# Altium footprint library Module.PcbLib: 57 footprints (part 1 of 4)
Each footprint in its own frame and in the unit in brackets; x right, y up, seen from the top. Pads: shape width x height; smd on the part's side, far side on the other; paste and mask are expansions set on the pad; w line width, h text height; cw(c..) or ccw(c..) is an arc to the next point about the centre after c.
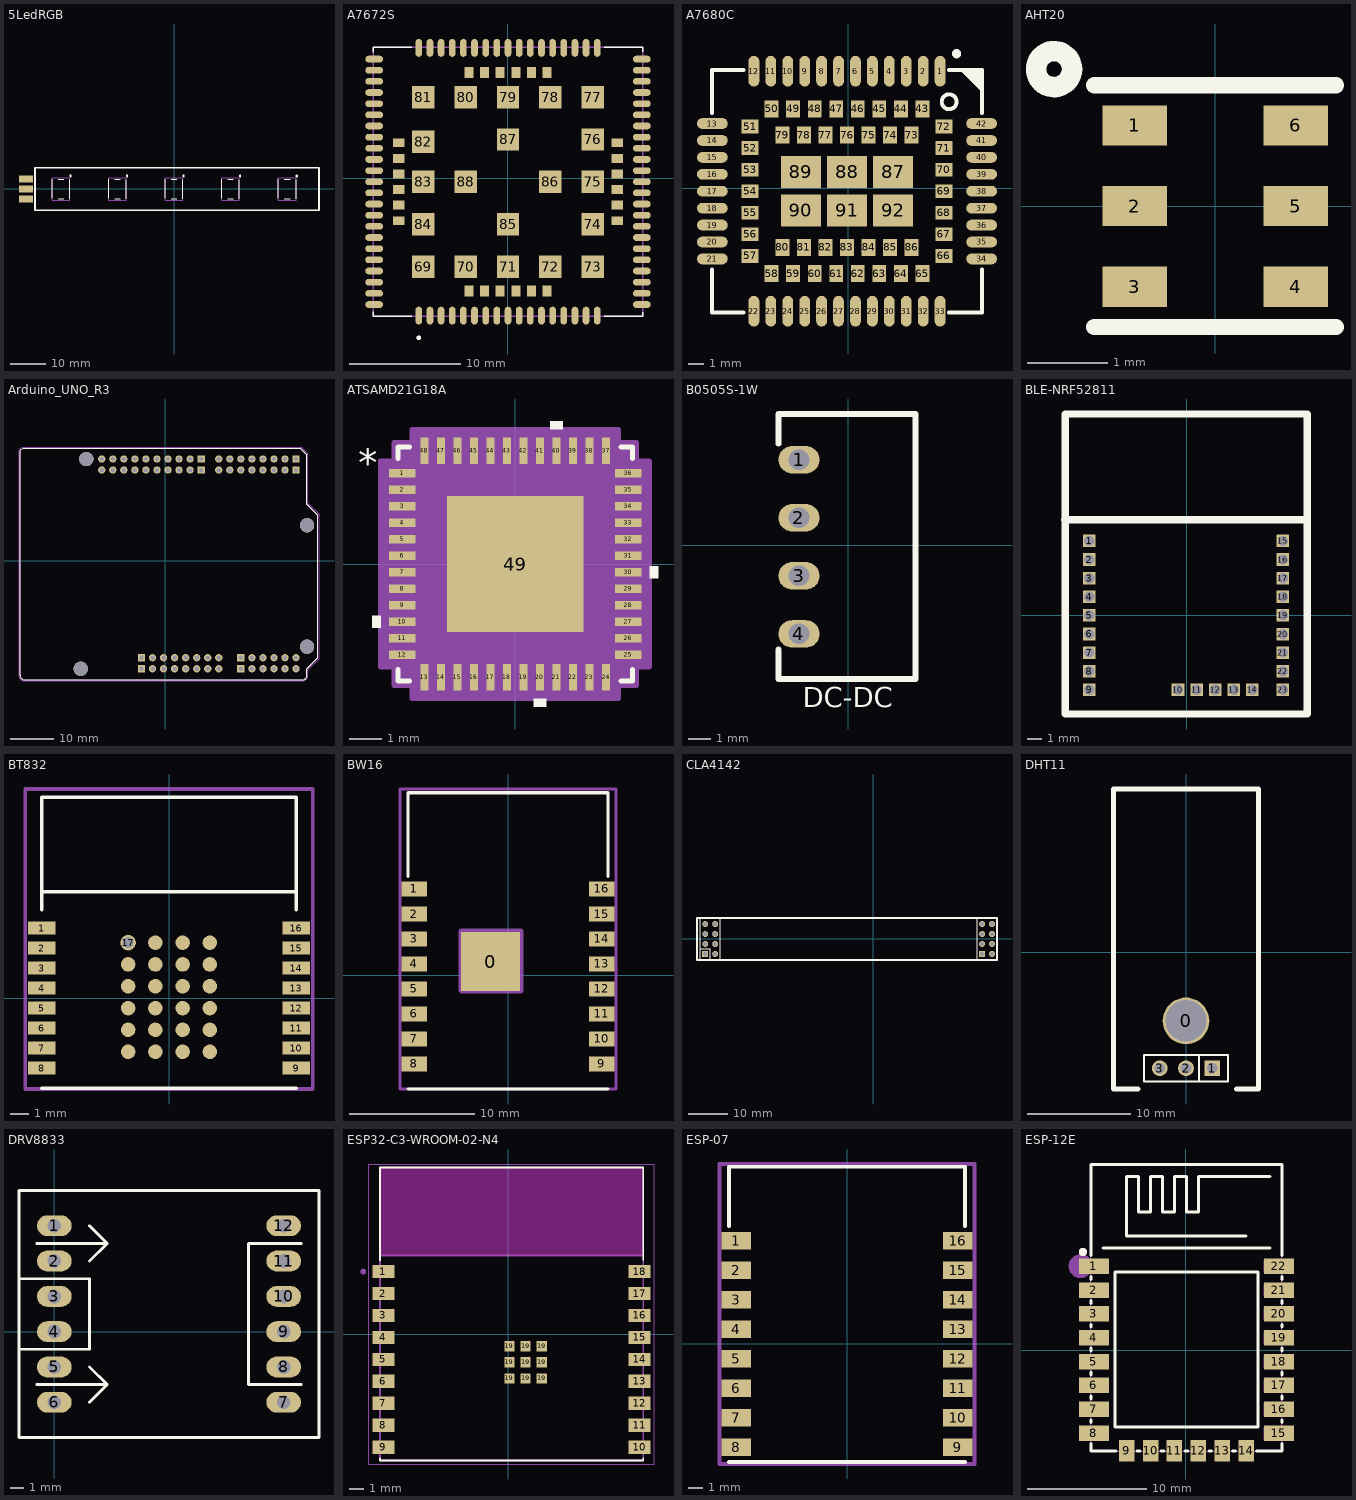
[diagram p0: the footprints below, top view; thin cyan lines are the x and y axes]

## 5LedRGB [mm]
pads (3):
  rrect0% 4x2 smd: 1(-41.875,-2.8) 2(-41.875,0) 3(-41.875,2.8)
Top Overlay:
  circle w0.254: c-29.3,3.7 r0.224
  circle w0.254: c-13.3,3.7 r0.224
  circle w0.254: c34.7,3.7 r0.224
  circle w0.254: c18.7,3.7 r0.224
  circle w0.254: c2.7,3.7 r0.224
  lines w0.2: -34.5,-2.675 -34.5,2.725 ; -32.8,-2.725 -31.2,-2.725 ; -32.8,2.725 -31.2,2.725 ; -29.5,-2.725 -29.5,2.675 ; -18.5,-2.675 -18.5,2.725 ; -16.8,-2.725 -15.2,-2.725 ; -16.8,2.725 -15.2,2.725 ; -13.5,-2.725 -13.5,2.675 ; -2.5,-2.675 -2.5,2.725 ; -0.8,-2.725 0.8,-2.725 ; -0.8,2.725 0.8,2.725 ; 2.5,-2.725 2.5,2.675 ; 13.5,-2.675 13.5,2.725 ; 15.2,-2.725 16.8,-2.725 ; 15.2,2.725 16.8,2.725 ; 18.5,-2.725 18.5,2.675 ; 29.5,-2.675 29.5,2.725 ; 31.2,-2.725 32.8,-2.725 ; 31.2,2.725 32.8,2.725 ; 34.5,-2.725 34.5,2.675
  lines w0.5: -39.375,-6 -39.375,6 41,6 41,-6 -39.375,-6
Mechanical 13:
  lines w0.2: -34.5,-3.2 -29.5,-3.2 -29.5,3.2 -34.5,3.2 -34.5,-3.2 ; -18.5,-3.2 -13.5,-3.2 -13.5,3.2 -18.5,3.2 -18.5,-3.2 ; -2.5,-3.2 2.5,-3.2 2.5,3.2 -2.5,3.2 -2.5,-3.2 ; 13.5,-3.2 18.5,-3.2 18.5,3.2 13.5,3.2 13.5,-3.2 ; 29.5,-3.2 34.5,-3.2 34.5,3.2 29.5,3.2 29.5,-3.2
3D body "User Library-ws2812B-1.STEP": height 1.55, standoff -0.02, extent -34.5,-2.725 -29.5,2.675
3D body "User Library-ws2812B-1.STEP": height 1.55, standoff -0.02, extent -18.5,-2.725 -13.5,2.675
3D body "User Library-ws2812B-1.STEP": height 1.55, standoff -0.02, extent 29.5,-2.725 34.5,2.675
3D body "User Library-ws2812B-1.STEP": height 1.55, standoff -0.02, extent 13.5,-2.725 18.5,2.675
3D body "User Library-ws2812B-1.STEP": height 1.55, standoff -0.02, extent -2.5,-2.725 2.5,2.675

## A7672S [mm]
pads (124):
  oval 0.6x1.6 smd: 1(-8,-12.33) 2(-7,-12.33) 3(-6,-12.33) 4(-5,-12.33) 5(-4,-12.33) 6(-3,-12.33) 7(-2,-12.33) 8(-1,-12.33) 9(0,-12.33) 10(1,-12.33) 11(2,-12.33) 12(3,-12.33) 13(4,-12.33) 14(5,-12.33) 15(6,-12.33) 16(7,-12.33) 17(8,-12.33) 35(8,11.67) 36(7,11.67) 37(6,11.67) 38(5,11.67) 39(4,11.67) 40(3,11.67) 41(2,11.67) 42(1,11.67) 43(0,11.67) 44(-1,11.67) 45(-2,11.67) 46(-3,11.67) 47(-4,11.67) 48(-5,11.67) 49(-6,11.67) 50(-7,11.67) 51(-8,11.67)
  oval 1.6x0.6 smd: 18(12,-8.33) 19(12,-7.33) 20(12,-6.33) 21(12,-5.33) 22(12,-4.33) 23(12,-3.33) 24(12,-2.33) 25(12,-1.33) 26(12,-0.33) 27(12,0.67) 28(12,1.67) 29(12,2.67) 30(12,3.67) 31(12,4.67) 32(12,5.67) 33(12,6.67) 34(12,7.67) 52(-12,7.67) 53(-12,6.67) 54(-12,5.67) 55(-12,4.67) 56(-12,3.67) 57(-12,2.67) 58(-12,1.67) 59(-12,0.67) 60(-12,-0.33) 61(-12,-1.33) 62(-12,-2.33) 63(-12,-3.33) 64(-12,-4.33) 65(-12,-5.33) 66(-12,-6.33) 67(-12,-7.33) 68(-12,-8.33) 89(12,-11.34) 90(12,-10.34) 91(12,-9.33) 92(12,8.67) 93(12,9.67) 94(12,10.67) 95(-12,10.67) 96(-12,9.67) 97(-12,8.67) 98(-12,-9.34) 99(-12,-10.34) 100(-12,-11.34)
  rect 2x2 smd: 69(-7.6,-7.941) 70(-3.8,-7.941) 71(0,-7.941) 72(3.8,-7.941) 73(7.6,-7.941) 74(7.6,-4.141) 75(7.6,-0.341) 76(7.6,3.459) 77(7.6,7.259) 78(3.8,7.259) 79(0,7.259) 80(-3.8,7.259) 81(-7.6,7.259) 82(-7.6,3.259) 83(-7.6,-0.341) 84(-7.6,-4.141) 85(0,-4.141) 86(3.8,-0.341) 87(0,3.459) 88(-3.8,-0.341)
  rect 0.8x1 smd: 101(-3.5,-10.14) 102(-2.1,-10.14) 103(-0.7,-10.14) 104(0.7,-10.14) 105(2.1,-10.14) 106(3.5,-10.14) 113(3.5,9.46) 114(2.1,9.46) 115(0.7,9.46) 116(-0.7,9.46) 117(-2.1,9.46) 118(-3.5,9.46)
  rect 1x0.8 smd: 107(9.8,-3.83) 108(9.8,-2.43) 109(9.8,-1.03) 110(9.8,0.37) 111(9.8,1.77) 112(9.8,3.17) 119(-9.8,3.17) 120(-9.8,1.77) 121(-9.8,0.37) 122(-9.8,-1.03) 123(-9.8,-2.43) 124(-9.8,-3.83)
Top Overlay:
  circle w0.2: c-8,-14.33 r0.1
  lines w0.127: -12.075,-12 -12.075,-12.405 -8.62,-12.405 ; -12.075,11.292 -12.075,11.745 -8.62,11.745 ; 8.62,-12.405 12.075,-12.405 12.075,-12.025 ; 8.62,11.745 12.075,11.745 12.075,11.343
Mechanical 13:
  circle w0.2: c-8,-14.33 r0.1
  lines w0.127: -12.075,-12.405 12.075,-12.405 12.075,11.745 -12.075,11.745 -12.075,-12.405
3D body: height 0.6, standoff 0, extent -12.09,-12.37 11.938,11.684
3D body: height 1.2, standoff 0.6, extent -11.557,-11.963 11.633,11.227

## A7680C [mm]
pads (92):
  oval 0.7x2 smd paste+0 mask+0.05: 1(5.971,7.61) 2(4.871,7.61) 3(3.771,7.61) 4(2.671,7.61) 5(1.571,7.61) 6(0.471,7.61) 7(-0.629,7.61) 8(-1.729,7.61) 9(-2.829,7.61) 10(-3.929,7.61) 11(-5.029,7.61) 12(-6.129,7.61) 22(-6.129,-7.99) 23(-5.029,-7.99) 24(-3.929,-7.99) 25(-2.829,-7.99) 26(-1.729,-7.99) 27(-0.629,-7.99) 28(0.471,-7.99) 29(1.571,-7.99) 30(2.671,-7.99) 31(3.771,-7.99) 32(4.871,-7.99) 33(5.971,-7.99)
  oval 2x0.7 smd paste+0 mask+0.05: 13(-8.829,4.21) 14(-8.829,3.11) 15(-8.829,2.01) 16(-8.829,0.91) 17(-8.829,-0.19) 18(-8.829,-1.29) 19(-8.829,-2.39) 20(-8.829,-3.49) 21(-8.829,-4.59) 34(8.671,-4.59) 35(8.671,-3.49) 36(8.671,-2.39) 37(8.671,-1.29) 38(8.671,-0.19) 39(8.671,0.91) 40(8.671,2.01) 41(8.671,3.11) 42(8.671,4.21)
  rect 0.9x1.1 smd paste+0 mask+0.05: 43(4.821,5.16) 44(3.421,5.16) 45(2.021,5.16) 46(0.621,5.16) 47(-0.779,5.16) 48(-2.179,5.16) 49(-3.579,5.16) 50(-4.979,5.16) 58(-4.979,-5.54) 59(-3.579,-5.54) 60(-2.179,-5.54) 61(-0.779,-5.54) 62(0.621,-5.54) 63(2.021,-5.54) 64(3.421,-5.54) 65(4.821,-5.54) 73(4.121,3.46) 74(2.721,3.46) 75(1.321,3.46) 76(-0.079,3.46) 77(-1.479,3.46) 78(-2.879,3.46) 79(-4.279,3.46) 80(-4.279,-3.84) 81(-2.879,-3.84) 82(-1.479,-3.84) 83(-0.079,-3.84) 84(1.321,-3.84) 85(2.721,-3.84) 86(4.121,-3.84)
  rect 1.1x0.9 smd paste+0 mask+0.05: 51(-6.379,4.01) 52(-6.379,2.61) 53(-6.379,1.21) 54(-6.379,-0.19) 55(-6.379,-1.59) 56(-6.379,-2.99) 57(-6.379,-4.39) 66(6.221,-4.39) 67(6.221,-2.99) 68(6.221,-1.59) 69(6.221,-0.19) 70(6.221,1.21) 71(6.221,2.61) 72(6.221,4.01)
  rect 2.6x2.1 smd paste+0 mask+0.05: 87(2.921,1.06) 88(-0.079,1.06) 89(-3.079,1.06) 90(-3.079,-1.44) 91(-0.079,-1.44) 92(2.921,-1.44)
Top Overlay:
  circle w0.254: c6.562,5.628 r0.484
  circle w0.3: c7.046,8.75 r0.15
  region: 8.684,6.287 8.684,7.684 7.287,7.684
  lines w0.254: -8.842,-5.27 -8.842,-8.064 -6.81,-8.064 ; -8.842,4.89 -8.842,7.684 -6.81,7.684 ; 6.552,-8.064 8.684,-8.064 8.684,-5.27 ; 6.552,7.684 8.684,7.684 8.684,4.89
Mechanical 15:
  region: 8.684,6.287 8.684,7.684 7.287,7.684

## AHT20 [mm]
pads (6):
  rect 0.8x0.5 smd: 1(-1,1) 2(-1,0) 3(-1,-1) 4(1,-1) 5(1,0) 6(1,1)
Top Overlay:
  circle w0.254: c-2,1.7 r0.224
  lines w0.2: -1.5,-1.5 1.5,-1.5 ; -1.5,1.5 1.5,1.5
3D body: height 1, standoff 0, extent -1.5,-1.5 1.5,1.5

## Arduino_UNO_R3 [mil]
pads (68):
  round 66 hole 40: 3V3(85,-980.32) 3V3(85,-880.32) 5V(185,-980.32) 5V(185,-880.32) A1(785,-980.32) A1(785,-880.32) A2(885,-980.32) A2(885,-880.32) A3(985,-980.32) A3(985,-880.32) A4(1085,-980.32) A4(1085,-880.32) A5(1185,-980.32) A5(1185,-880.32) AD4/SDA(-475,819.68) AD4/SDA(-475,919.68) AD5/SCL(-575,819.68) AD5/SCL(-575,919.68) AREF(-375,819.68) AREF(-375,919.68) D1(1085,819.68) D1(1085,919.68) D2(985,819.68) D2(985,919.68) D3(885,819.68) D3(885,919.68) D4(785,819.68) D4(785,919.68) D5(685,819.68) D5(685,919.68) D6(585,819.68) D6(585,919.68) D7(485,819.68) D7(485,919.68) D9(225,819.68) D9(225,919.68) D10(125,819.68) D10(125,919.68) D11(25,819.68) D11(25,919.68) D12(-75,819.68) D12(-75,919.68) D13(-175,819.68) D13(-175,919.68) GND_1(385,-980.32) GND_1(385,-880.32) GND_2(285,-980.32) GND_2(285,-880.32) GND_3(-275,819.68) GND_3(-275,919.68) IOREF(-115,-980.32) IOREF(-115,-880.32) RST(-15,-980.32) RST(-15,-880.32) VIN(485,-980.32) VIN(485,-880.32)
  rect 66x66 / inner round 66 / far side rect 66x66 hole 40: A0(685,-980.32) A0(685,-880.32) D0(1185,819.68) D0(1185,919.68) D8(325,819.68) D8(325,919.68) NC(-215,-980.32) NC(-215,-880.32)
  round 129.92 hole 129.92 unplated: ""(-765,-980.32) ""(-715,919.68) ""(1285,-780.32) ""(1285,319.69)
Top Overlay:
  lines w5: -1315,-1041.22 -1313.33,-1051.21 -1310,-1060.38 -1303.34,-1068.71 -1295.01,-1075.37 -1285.84,-1078.7 -1275.85,-1080.37 1244.09,-1080.37 1254.09,-1078.7 1263.26,-1075.37 1271.59,-1068.71 1278.25,-1060.38 1281.58,-1051.21 1283.25,-1041.22 1283.25,-980.4 1383.21,-880.44 1383.21,408.27 1283.25,508.24 1283.25,958.07 1223.27,1018.06 -1275.85,1018.06 -1285.84,1016.39 -1295.01,1012.22 -1303.34,1006.39 -1310,998.06 -1313.33,988.9 -1315,978.07 -1315,-1041.22
Mechanical 13:
  lines w5: -1315,-1041.22 -1313.33,-1051.21 -1310,-1060.38 -1303.34,-1068.71 -1295.01,-1075.37 -1285.84,-1078.7 -1275.85,-1080.37 1244.09,-1080.37 1254.09,-1078.7 1263.26,-1075.37 1271.59,-1068.71 1278.25,-1060.38 1281.58,-1051.21 1283.25,-1041.22 1283.25,-980.4 1383.21,-880.44 1383.21,408.27 1283.25,508.24 1283.25,958.07 1223.27,1018.06 -1275.85,1018.06 -1285.84,1016.39 -1295.01,1012.22 -1303.34,1006.39 -1310,998.06 -1313.33,988.9 -1315,978.07 -1315,-1041.22
Mechanical 15:
  lines w1.97: -1324.84,-1041.22 -1324.84,-1040.94 -1324.84,987.91 -1323.18,998.74 -1319.84,1007.91 -1313.18,1016.24 -1304.85,1022.07 -1295.69,1026.23 -1285.69,1027.9 1233.11,1027.9 1293.09,967.92 1293.09,518.08 1393.06,418.11 1393.06,-890.28 1293.09,-990.25 1293.09,-1041.22 ; -1324.83,-1040.82 ccw(c-1278.3,-1044.07) -1285.6,-1090.14 ; -1285.69,-1090.21 1244.09,-1090.21 ; 1243.61,-1090.18 ccw(c1241.81,-1038.7) 1293.25,-1041.39
3D body "Assembly Arduino Uno R3.STEP": height 496.56, standoff -137.3, extent -1571,-1064.57 1381.94,1033.86

## ATSAMD21G18A [mil]
pads (49):
  rect 32x10 smd paste+0 mask+0: 1(-137,110) 2(-137,90) 3(-137,70) 4(-137,50) 5(-137,30) 6(-137,10) 7(-137,-10) 8(-137,-30) 9(-137,-50) 10(-137,-70) 11(-137,-90) 12(-137,-110) 25(137,-110) 26(137,-90) 27(137,-70) 28(137,-50) 29(137,-30) 30(137,-10) 31(137,10) 32(137,30) 33(137,50) 34(137,70) 35(137,90) 36(137,110)
  rect 10x32 smd paste+0 mask+0: 13(-110,-137) 14(-90,-137) 15(-70,-137) 16(-50,-137) 17(-30,-137) 18(-10,-137) 19(10,-137) 20(30,-137) 21(50,-137) 22(70,-137) 23(90,-137) 24(110,-137) 37(110,137) 38(90,137) 39(70,137) 40(50,137) 41(30,137) 42(10,137) 43(-10,137) 44(-30,137) 45(-50,137) 46(-70,137) 47(-90,137) 48(-110,137)
  rect 165x165 smd paste-82 mask+0: 49(0,0)
Top Overlay:
  region: -163,-62.5 -173,-62.5 -173,-77.5 -163,-77.5
  region: 37.5,-163 22.5,-163 22.5,-173 37.5,-173
  region: 163,-2.5 173,-2.5 173,-17.5 163,-17.5
  region: 57.5,163 42.5,163 42.5,173 57.5,173
  lines w6: -142,-128.1 -142,-142 -128.1,-142 ; -142,128.1 -142,142 -128.1,142 ; 128.1,-142 142,-142 142,-128.1 ; 128.1,142 142,142 142,128.1
  text "*" at -190.5,95 h59.06
Top Paste:
  region: -31.44,78.56 -78.56,78.56 -78.56,31.44 -31.44,31.44
  region: -31.44,23.56 -78.56,23.56 -78.56,-23.56 -31.44,-23.56
  region: -31.44,-31.44 -78.56,-31.44 -78.56,-78.56 -31.44,-78.56
  region: 23.56,78.56 -23.56,78.56 -23.56,31.44 23.56,31.44
  region: 23.56,23.56 -23.56,23.56 -23.56,-23.56 23.56,-23.56
  region: 23.56,-31.44 -23.56,-31.44 -23.56,-78.56 23.56,-78.56
  region: 78.56,78.56 31.44,78.56 31.44,31.44 78.56,31.44
  region: 78.56,23.56 31.44,23.56 31.44,-23.56 78.56,-23.56
  region: 78.56,-31.44 31.44,-31.44 31.44,-78.56 78.56,-78.56
Mechanical 13:
  drawing of 197 lines, arcs and shapes, not listed
  text "*" at -133.5,95 h59.06
Mechanical 15:
  region: -125,-147 -147,-147 -147,-125 -163,-125 -163,125 -147,125 -147,147 -125,147 -125,163 125,163 125,147 147,147 147,125 163,125 163,-125 147,-125 147,-147 125,-147 125,-163 -125,-163
  lines w6: -163,-125 -147,-125 -147,-147 -125,-147 -125,-163 125,-163 125,-147 147,-147 147,-125 163,-125 163,125 147,125 147,147 125,147 125,163 -125,163 -125,147 -147,147 -147,125 -163,125 -163,-125
3D body "QFN48_7X7MC_MCH.step": height 65.12, standoff 0, extent -140.98,-140.98 140.98,140.98

## B0505S-1W [mm]
pads (4):
  oval 1.8x1.2 hole 0.9: 1(-2.155,3.75) 2(-2.155,1.21) 3(-2.155,-1.33) 4(-2.155,-3.87)
Top Overlay:
  lines w0.254: -3.055,-4.55 -3.055,-5.85 2.945,-5.85 2.945,5.75 -3.055,5.75 -3.055,4.45
  text "DC-DC" at -2,-7.375 h1.5
3D body: height 10.2, standoff 0, extent -3.055,-5.85 2.945,5.75

## BLE-NRF52811 [mm]
pads (23):
  rect 0.86x0.86 hole 0.7: 1(-6.63,5.055) 2(-6.63,3.785) 3(-6.63,2.515) 4(-6.63,1.245) 5(-6.63,-0.025) 6(-6.63,-1.295) 7(-6.63,-2.565) 8(-6.63,-3.835) 9(-6.63,-5.105) 10(-0.585,-5.105) 11(0.685,-5.105) 12(1.955,-5.105) 13(3.225,-5.105) 14(4.495,-5.105) 15(6.578,5.055) 16(6.578,3.785) 17(6.578,2.515) 18(6.578,1.245) 19(6.578,-0.025) 20(6.578,-1.321) 21(6.578,-2.565) 22(6.578,-3.835) 23(6.578,-5.105)
Top Overlay:
  lines w0.5: -8.3,6.5 8.229,6.5 ; -8.281,-6.756 8.229,-6.756 8.229,13.718 -8.281,13.718 -8.281,-6.756
Mechanical 1:
  lines w0.05: -0.803,-5.031 -0.728,-5.105
Mechanical 13:
  text ".Description" at -5.1,-0.4 h2
Mechanical 15:
  text ".Comment" at -4.1,-0.3 h2
3D body "NRF52811_v1.3.step": height 2.1, standoff 0.11, extent -8.331,-6.833 8.179,13.641

## BT832 [mm]
pads (40):
  rect 1.5x0.7 smd: 1(-7,3.85) 2(-7,2.75) 3(-7,1.65) 4(-7,0.55) 5(-7,-0.55) 6(-7,-1.65) 7(-7,-2.75) 8(-7,-3.85) 9(7,-3.85) 10(7,-2.75) 11(7,-1.65) 12(7,-0.55) 13(7,0.55) 14(7,1.65) 15(7,2.75) 16(7,3.85)
  round 0.85 hole 0.6: 17(-2.25,3.05)
  round 0.8 smd: ""(-2.25,-2.95) ""(-2.25,-1.75) ""(-2.25,-0.55) ""(-2.25,0.65) ""(-2.25,1.85) ""(-0.75,-2.95) ""(-0.75,-1.75) ""(-0.75,-0.55) ""(-0.75,0.65) ""(-0.75,1.85) ""(-0.75,3.05) ""(0.75,-2.95) ""(0.75,-1.75) ""(0.75,-0.55) ""(0.75,0.65) ""(0.75,1.85) ""(0.75,3.05) ""(2.25,-2.95) ""(2.25,-1.75) ""(2.25,-0.55) ""(2.25,0.65) ""(2.25,1.85) ""(2.25,3.05)
Top Overlay:
  lines w0.2: -7,-4.95 7,-4.95 ; -7,4.85 -7,11.05 7,11.05 7,4.85 ; -7,5.85 7,5.85
Mechanical 13:
  lines w0.2: -7.9,-5 7.9,-5 7.9,11.5 -7.9,11.5 -7.9,-5
  text ".Designator" at -3.8,0.1 h1.5
Mechanical 15:
  lines w0.2: -7.9,-5 -7.9,11.5 7.9,11.5 7.9,-5 -7.9,-5
  text ".Comment" at -3.8,0.1 h1.5
3D body: height 1.5, standoff 0.6, extent -7,-4.95 7,5.85
3D body: height 0.6, standoff 0, extent -7,-4.95 7,11.05

## BW16 [mm]
pads (17):
  rect 4.7x4.7 smd: 0(-1.4,1.1)
  rect 2x1.2 smd: 1(-7.5,6.9) 2(-7.5,4.9) 3(-7.5,2.9) 4(-7.5,0.9) 5(-7.5,-1.1) 6(-7.5,-3.1) 7(-7.5,-5.1) 8(-7.5,-7.1) 9(7.5,-7.1) 10(7.5,-5.1) 11(7.5,-3.1) 12(7.5,-1.1) 13(7.5,0.9) 14(7.5,2.9) 15(7.5,4.9) 16(7.5,6.9)
Top Overlay:
  lines w0.254: -8,-9.1 8,-9.1 ; -8,7.9 -8,14.6 8,14.6 8,7.9
Mechanical 1:
  lines w0.5: -3.7,-1.2 1,-1.2 1,3.5 -3.7,3.5 -3.7,-1.2
Mechanical 13:
  lines w0.254: -8.636,-9.1 -8.636,14.9 8.636,14.9 8.636,-9.1 -8.636,-9.1
  text ".Designator" at -6.858,-0.354 h3
Mechanical 15:
  lines w0.254: -8.636,-9.1 -8.636,14.9 8.636,14.9 8.636,-9.1 -8.636,-9.1
  text ".Comment" at -6.858,-0.354 h3
3D body "ESP8266-ESP07.STEP": height 2.2, standoff -0.01, extent -8,-8.1 8,11.9

## CLA4142 [mm]
pads (16):
  rect 1.52x1.52 hole 1.02: 1(-42.893,-3.933) 5(27.71,-3.915)
  round 1.52 hole 1.02: 1(-40.353,-3.933) 2(-42.893,-1.393) 2(-40.353,-1.393) 3(-42.893,1.147) 3(-40.353,1.147) 4(-42.893,3.687) 4(-40.353,3.687) 5(27.71,-1.375) 5(30.25,-3.915) 5(30.25,-1.375) 6(27.71,1.165) 6(27.71,3.705) 6(30.25,1.165) 6(30.25,3.705)
Top Overlay:
  lines w0.2: -44.163,-2.663 -41.623,-2.663 -41.623,-5.453 ; -44.163,-5.453 -39.083,-5.453 -39.083,5.207 -44.163,5.207 -44.163,-5.453 ; 26.44,-5.435 31.52,-5.435 31.52,5.225 26.44,5.225 26.44,-5.435
  lines w0.5: -44.982,-5.435 -44.145,-5.435 26.44,-5.435 31.52,-5.435 31.52,5.207 -44.163,5.207 -44.982,5.207 -44.982,-5.435
3D body "potentio_assem_asm.stp": height 30.7, standoff 5.25, extent -45,-4.625 30,4.375
3D body "61300821821.stp": height 8.51, standoff -3.09, extent -44.163,-5.453 -39.083,5.207
3D body "61300821821.stp": height 8.51, standoff -3.09, extent 26.44,-5.435 31.52,5.225

## DHT11 [mm]
pads (4):
  round 4.5 hole 4: 0(0,-6.625)
  rect 1.52x1.52 hole 1.02: 1(2.54,-11.2)
  round 1.52 hole 1.02: 2(0,-11.2) 3(-2.54,-11.2)
Top Overlay:
  lines w0.2: 1.27,-12.47 1.27,-9.93 ; -4.06,-12.47 4.06,-12.47 4.06,-9.93 -4.06,-9.93 -4.06,-12.47
  lines w0.5: -4.625,-13.2 -7,-13.2 -7,15.75 7,15.75 7,-13.2 4.875,-13.2
3D body "61300311821.stp": height 8.51, standoff -3.09, extent -4.06,-12.45 4.06,-9.95
3D body "DHT11 module.STEP": height 15.6, standoff 9.1, extent -7,-19.6 7,15.45

## DRV8833 [mm]
pads (12):
  oval 2.5x1.5 hole 1: 1(0,7.62) 2(0,5.08) 3(0,2.54) 4(0,0) 5(0,-2.54) 6(0,-5.08) 7(16.51,-5.08) 8(16.51,-2.54) 9(16.51,0) 10(16.51,2.54) 11(16.51,5.08) 12(16.51,7.62)
Top Overlay:
  lines w0.2: -2.54,-1.27 2.54,-1.27 2.54,3.81 -2.54,3.81 ; -1.27,-3.81 3.81,-3.81 ; -1.27,6.35 3.81,6.35 ; 2.54,-5.08 3.81,-3.81 ; 2.54,-2.54 3.81,-3.81 ; 2.54,5.08 3.81,6.35 ; 2.54,7.62 3.81,6.35 ; 17.78,-3.81 13.97,-3.81 13.97,6.35 17.78,6.35 ; -2.54,-7.62 -2.54,2.54 -2.54,10.16 19.05,10.16 19.05,-7.62 -2.54,-7.62

## ESP32-C3-WROOM-02-N4 [mm]
pads (39):
  rect 1.5x0.9 smd: 1(-8.536,4.277) 2(-8.536,2.777) 3(-8.536,1.277) 4(-8.536,-0.223) 5(-8.536,-1.723) 6(-8.536,-3.223) 7(-8.536,-4.723) 8(-8.536,-6.223) 9(-8.536,-7.723) 10(8.964,-7.723) 11(8.964,-6.223) 12(8.964,-4.723) 13(8.964,-3.223) 14(8.964,-1.723) 15(8.964,-0.223) 16(8.964,1.277) 17(8.964,2.777) 18(8.964,4.277)
  rect 0.7x0.7 smd: 19(0.074,-3.023) 19(0.074,-1.923) 19(0.074,-0.823) 19(1.174,-3.023) 19(1.174,-1.923) 19(1.174,-0.823) 19(2.274,-3.023) 19(2.274,-1.923) 19(2.274,-0.823)
  round 0 all layers, no hole mask+0: 20(0.074,-2.473) 20(0.074,-1.373) 20(0.624,-3.023) 20(0.624,-1.923) 20(0.624,-0.823) 20(1.174,-2.473) 20(1.174,-1.373) 20(1.724,-3.023) 20(1.724,-1.923) 20(1.724,-0.823) 20(2.274,-2.473) 20(2.274,-1.373)
Top Overlay:
  lines w0.127: -8.786,-8.493 -8.786,-8.623 9.214,-8.623 9.214,-8.493 ; -8.786,5.047 -8.786,11.377 9.214,11.377 9.214,5.047
Keep-Out Layer:
  region: 9.214,5.377 -8.786,5.377 -8.786,11.377 9.214,11.377
  region: 9.214,5.377 -8.786,5.377 -8.786,11.377 9.214,11.377
Mechanical 29:
  circle w0.2: c-9.921,4.271 r0.1
  circle w0.2: c-9.921,4.271 r0.1
  lines w0.127: -8.786,5.377 9.214,5.377 ; -8.786,5.377 -8.786,-8.623 9.214,-8.623 9.214,5.377 ; -8.786,5.377 -8.786,11.377 9.214,11.377 9.214,5.377
  text ".Designator" at -6.72,-1.952 h3
Mechanical 31:
  lines w0.05: -9.536,-8.873 9.964,-8.873 9.964,11.627 -9.536,11.627 -9.536,-8.873
  text ".Comment" at -6.708,-2.101 h3
3D body "step_temp.STEP": height 3.35, standoff 0, extent -8.786,-8.623 9.214,11.377

## ESP-07 [mm]
pads (16):
  rect 2x1.2 smd: 1(-7.5,7) 2(-7.5,5) 3(-7.5,3) 4(-7.5,1) 5(-7.5,-1) 6(-7.5,-3) 7(-7.5,-5) 8(-7.5,-7) 9(7.5,-7) 10(7.5,-5) 11(7.5,-3) 12(7.5,-1) 13(7.5,1) 14(7.5,3) 15(7.5,5) 16(7.5,7)
Top Overlay:
  lines w0.254: -8,-8 8,-8 ; -8,8 -8,12 8,12 8,8
Mechanical 13:
  lines w0.254: -8.636,-8.128 -8.636,12.192 8.636,12.192 8.636,-8.128 -8.636,-8.128
  text ".Designator" at -6.858,-0.254 h3
Mechanical 15:
  lines w0.254: -8.636,-8.128 -8.636,12.192 8.636,12.192 8.636,-8.128 -8.636,-8.128
  text ".Comment" at -6.858,-0.254 h3
3D body "ESP8266-ESP07.STEP": height 2.2, standoff -0.01, extent -8,-8 8,12

## ESP-12E [mm]
pads (22):
  rect 2.5x1.3 smd paste-100 mask+0.051: 1(-7.706,7.061) 2(-7.706,5.061) 3(-7.706,3.061) 4(-7.706,1.061) 5(-7.706,-0.939) 6(-7.706,-2.939) 7(-7.706,-4.939) 8(-7.706,-6.939) 15(7.794,-6.939) 16(7.794,-4.939) 17(7.794,-2.939) 18(7.794,-0.939) 19(7.794,1.061) 20(7.794,3.061) 21(7.794,5.061) 22(7.794,7.061)
  rect 1.3x1.8 smd paste-100 mask+0.051: 9(-4.957,-8.419) 10(-2.957,-8.418) 11(-0.957,-8.418) 12(1.043,-8.418) 13(3.043,-8.418) 14(5.043,-8.419)
Top Overlay:
  circle w0.4: c-8.625,8.25 r0.15
  lines w0.254: -7.948,-7.82 -7.948,-8.418 -5.838,-8.418 ; -7.948,-6.058 -7.948,-5.82 ; -7.948,-4.058 -7.948,-3.82 ; -7.948,-2.058 -7.948,-1.82 ; -7.948,-0.058 -7.948,0.18 ; -7.948,1.942 -7.948,2.18 ; -7.948,3.942 -7.948,4.18 ; -7.948,5.942 -7.948,6.18 ; -7.948,7.942 -7.948,15.561 8.042,15.561 8.042,7.942 ; -6.958,8.582 7.042,8.582 ; -4.076,-8.418 -3.838,-8.418 ; -2.076,-8.418 -1.838,-8.418 ; -0.076,-8.418 0.162,-8.418 ; 1.924,-8.418 2.162,-8.418 ; 3.924,-8.418 4.162,-8.418 ; 5.042,9.582 -4.958,9.582 -4.958,14.582 -3.958,14.582 -3.958,11.582 -2.958,11.582 -2.958,14.582 -1.958,14.582 -1.958,11.582 -0.958,11.582 -0.958,14.582 0.042,14.582 0.042,11.582 1.042,11.582 1.042,14.582 7.042,14.582 ; 5.924,-8.418 8.042,-8.418 8.042,-7.82 ; 8.042,-6.058 8.042,-5.82 ; 8.042,-4.058 8.042,-3.82 ; 8.042,-2.058 8.042,-1.82 ; 8.042,-0.058 8.042,0.18 ; 8.042,1.942 8.042,2.18 ; 8.042,3.942 8.042,4.18 ; 8.042,5.942 8.042,6.18 ; -5.958,-6.418 6.042,-6.418 6.042,6.582 -5.958,6.582 -5.958,-6.418
Top Paste:
  drawing of 22 lines, arcs and shapes, not listed
Dimensions:
  circle w1: c-8.821,7.061 r0.5
Mechanical 15:
  region: -4.457,-7.539 -4.457,-8.439 -5.457,-8.439 -5.457,-7.539
  region: -2.457,-7.538 -2.457,-8.438 -3.457,-8.438 -3.457,-7.538
  region: -0.457,-7.538 -0.457,-8.438 -1.457,-8.438 -1.457,-7.538
  region: 1.543,-7.538 1.543,-8.438 0.543,-8.438 0.543,-7.538
  region: 3.543,-7.538 3.543,-8.438 2.543,-8.438 2.543,-7.538
  region: 5.543,-7.539 5.543,-8.439 4.543,-8.439 4.543,-7.539
  region: -7.956,7.561 -6.456,7.561 -6.456,6.561 -7.956,6.561
  region: -7.956,5.561 -6.456,5.561 -6.456,4.561 -7.956,4.561
  region: -7.956,3.561 -6.456,3.561 -6.456,2.561 -7.956,2.561
  region: -7.956,1.561 -6.456,1.561 -6.456,0.561 -7.956,0.561
  region: -7.956,-0.439 -6.456,-0.439 -6.456,-1.439 -7.956,-1.439
  region: -7.956,-2.439 -6.456,-2.439 -6.456,-3.439 -7.956,-3.439
  region: -7.956,-4.439 -6.456,-4.439 -6.456,-5.439 -7.956,-5.439
  region: -7.956,-6.439 -6.456,-6.439 -6.456,-7.439 -7.956,-7.439
  region: 8.044,-7.439 6.544,-7.439 6.544,-6.439 8.044,-6.439
  region: 8.044,-5.439 6.544,-5.439 6.544,-4.439 8.044,-4.439
  region: 8.044,-3.439 6.544,-3.439 6.544,-2.439 8.044,-2.439
  region: 8.044,-1.439 6.544,-1.439 6.544,-0.439 8.044,-0.439
  region: 8.044,0.561 6.544,0.561 6.544,1.561 8.044,1.561
  region: 8.044,2.561 6.544,2.561 6.544,3.561 8.044,3.561
  region: 8.044,4.561 6.544,4.561 6.544,5.561 8.044,5.561
  region: 8.044,6.561 6.544,6.561 6.544,7.561 8.044,7.561
  region: -7.956,15.501 -7.931,15.501 -7.896,15.536 -7.896,15.586 -7.931,15.621 -7.956,15.621 -7.981,15.621 -8.016,15.586 -8.016,15.536 -7.981,15.501
  lines w0.051: -7.956,-8.439 -7.956,15.561 8.044,15.561 8.044,-8.439 -7.956,-8.439
3D body "ESP-12F.STEP": height 3.17, standoff 0, extent -7.958,-8.439 8.042,15.561